# Altium footprint library KF.PcbLib: 39 footprints (part 1 of 3)
Each footprint in its own frame and in the unit in brackets; x right, y up, seen from the top. Pads: shape width x height; smd on the part's side, far side on the other; paste and mask are expansions set on the pad; w line width, h text height; cw(c..) or ccw(c..) is an arc to the next point about the centre after c.
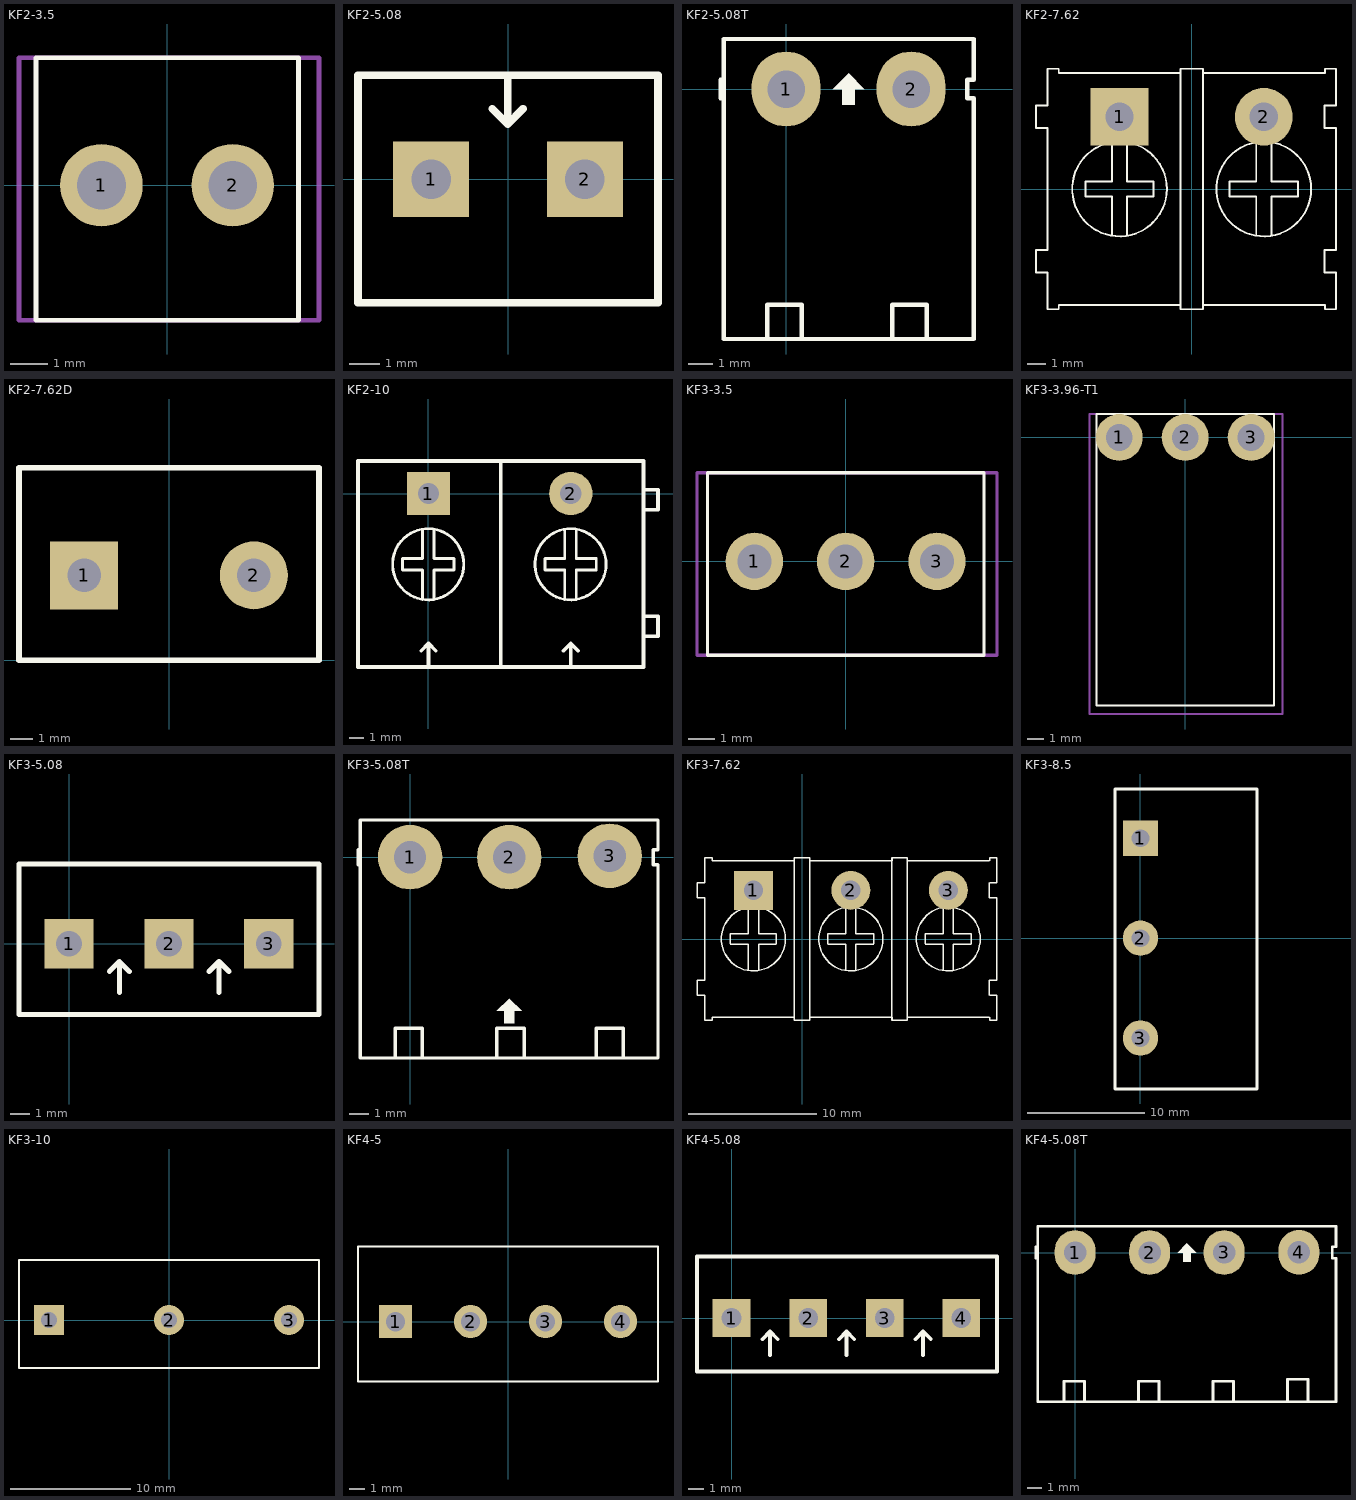
[diagram p0: the footprints below, top view; thin cyan lines are the x and y axes]

## KF2-3.5 [mm] "3,50mm - modular - blue - Horizontal wire entry - Pressure clamp - 8,4mm height - 02p"
height 8.4
pads (2):
  round 2.2 hole 1.3: 1(-1.75,0) 2(1.75,0)
Top Overlay:
  lines w0.127: -3.5,-3.6 3.5,-3.6 3.5,3.4 -3.5,3.4 -3.5,-3.6
Mechanical 13:
  lines w0.127: -3.95,-3.6 -3.95,3.4 4.05,3.4 4.05,-3.6 -3.95,-3.6
3D body "691103110002.stp": height 8.41, standoff -3.79, extent -3.95,-3.6 4.05,3.4

## KF2-5.08 [mm]
pads (2):
  rect 2.5x2.5 hole 1.3: 1(-2.54,0) 2(2.54,0)
Top Overlay:
  lines w0.254: -0.521,2.324 -0.013,1.816 ; -0.013,3.378 -0.013,1.816 ; 0.495,2.324 -0.013,1.816 ; -4.953,-4.077 -4.953,3.429 4.953,3.429 4.953,-4.077 -4.953,-4.077
3D body "SW3DPS-HDR1x2-MED-GREEN.STEP": height 10, standoff -4, extent -5,-4.071 5,3.429

## KF2-5.08T [mil] "Header 2, 2 pin, hight 300mil, Pin to Pin 200, Colour Green"
height 300
pads (2):
  oval 110x120 hole 60: 1(0,0) 2(200,0)
Top Overlay:
  region: 100,25 75,0 90,0 90,-25 110,-25 110,0 125,0
  lines w7: -105,-15 -105,15 ; -30,-400 -30,-345 25,-345 25,-400 ; 170,-400 170,-345 225,-345 225,-400 ; -100,-400 300,-400 300,-15 290,-15 290,15 300,15 300,80 180.5,80 -18.5,80 -100,80 -100,-400
3D body "SW3dPS-5EHDR_2P.STEP": height 333.51, standoff -157.48, extent -96.7,-399.22 297,73.22

## KF2-7.62 [mil]
pads (2):
  rect 120x120 hole 59.06 unplated: 1(-150,150)
  round 120 hole 59.06 unplated: 2(150,150)
Top Overlay:
  circle w4: c-150,0 r98.43
  circle w4: c150,0 r98.43
  lines w4: -323.62,-173.62 -323.62,-126.38 -300,-126.38 -300,126.38 -323.62,126.38 -323.62,173.62 ; -323,-173.62 -300,-173.62 -300,-250 -277,-250 ; -323,173.62 -300,173.62 -300,250 -277,250 ; -276.38,-250 -276.38,-241 -23.62,-241 -23.62,-250 23.62,-250 23.62,-241 276.38,-241 ; -276.38,250 -276.38,241 -23.62,241 -23.62,250 23.62,250 23.62,241 276.38,241 ; -221,-15.75 -165.75,-15.75 ; -221,-15 -221,16 ; -221,15.75 -165.75,15.75 ; -165.75,-97 -165.75,-16 ; -165.75,16 -165.75,97 ; -134.25,-97 -134.25,-16 ; -134.25,-15.75 -79,-15.75 ; -134.25,15.75 -79,15.75 ; -134.25,16 -134.25,97 ; -79,-15 -79,16 ; -23.62,-244 -23.62,245 ; 23.62,-244 23.62,245 ; 79,-15.75 134.25,-15.75 ; 79,-15 79,16 ; 79,15.75 134.25,15.75 ; 134.25,-97 134.25,-16 ; 134.25,16 134.25,97 ; 165.75,-97 165.75,-16 ; 165.75,-15.75 221,-15.75 ; 165.75,15.75 221,15.75 ; 165.75,16 165.75,97 ; 221,-15 221,16 ; 276.38,-173.62 276.38,-126.38 300,-126.38 300,126.38 276.38,126.38 276.38,173.62 ; 277,-241 277,-250 300,-250 300,-173.62 277,-173.62 ; 277,173.62 300,173.62 300,250 277,250 277,241
3D body "691313410002.stp": height 336.61, standoff -155.51, extent -300,-241.22 300,231.22

## KF2-7.62D [mil]
pads (2):
  rect 120x120 hole 59.06 unplated: 1(-150,150)
  round 120 hole 59.06 unplated: 2(150,150)
Top Overlay:
  lines w10: -265,0 265,0 265,340 -265,340 -265,0
3D body "17436.stp": height 472.44, standoff -153.54, extent -264.57,0 264.57,338.58

## KF2-10 [mil]
pads (2):
  rect 120x120 hole 59.06 unplated: 1(0,0)
  round 120 hole 59.06 unplated: 2(393.7,0)
Top Overlay:
  circle w7.87: c-0.75,-195.75 r98.43
  circle w7.87: c392.95,-195.75 r98.43
  lines w7.87: -71.75,-211.5 -16.5,-211.5 ; -71.75,-210.75 -71.75,-179.75 ; -71.75,-180 -16.5,-180 ; -16.5,-292.75 -16.5,-211.75 ; -16.5,-179.75 -16.5,-98.75 ; 15,-292.75 15,-211.75 ; 15,-211.5 70.25,-211.5 ; 15,-180 70.25,-180 ; 15,-179.75 15,-98.75 ; 70.25,-210.75 70.25,-179.75 ; 321.95,-211.5 377.2,-211.5 ; 321.95,-210.75 321.95,-179.75 ; 321.95,-180 377.2,-180 ; 377.2,-292.75 377.2,-211.75 ; 377.2,-179.75 377.2,-98.75 ; 408.7,-292.75 408.7,-211.75 ; 408.7,-211.5 463.95,-211.5 ; 408.7,-180 463.95,-180 ; 408.7,-179.75 408.7,-98.75 ; 463.95,-210.75 463.95,-179.75
  lines w10: -20,-435 0,-415 ; 0,-476.5 0,-415 ; 20,-435 0,-415 ; 200,-480 200,90 ; 373.7,-435 393.7,-415 ; 393.7,-476.5 393.7,-415 ; 413.7,-435 393.7,-415 ; -195,-480 595,-480 595,90 -195,90 -195,-480 ; 595,-395 635,-395 635,-340 595,-340 595,-395 ; 595,-45 635,-45 635,10 595,10 595,-45
3D body "KF1000-2P.step": height 570.87, standoff -332.99, extent -193.39,-480.87 633.39,90

## KF3-3.5 [mm] "3,50mm - modular - blue - Horizontal wire entry - Pressure clamp - 8,4mm height - 03p"
height 8.4
pads (3):
  round 2.2 hole 1.3: 1(-3.5,0) 2(0,0) 3(3.5,0)
Top Overlay:
  lines w0.127: -5.3,-3.6 -5.3,3.4 5.3,3.4 5.3,-3.6 -5.3,-3.6
Mechanical 13:
  lines w0.127: -5.7,-3.6 -5.7,3.4 5.8,3.4 5.8,-3.6 -5.7,-3.6
3D body "691103110003.stp": height 8.41, standoff -3.79, extent -5.7,-3.6 5.8,3.4

## KF3-3.96-T1 [mm] "3,96mm - modular - blue - Horizontal wire entry - Pressure clamp - 10mm height - 03p"
height 10
pads (3):
  round 2.8 hole 1.6: 1(-3.937,0) 2(0,0) 3(3.937,0)
Top Overlay:
  lines w0.127: -5.3,-16.002 5.3,-16.002 5.3,1.397 -5.3,1.397 -5.3,-16.002
Mechanical 13:
  lines w0.127: -5.7,-16.51 5.8,-16.51 5.8,1.397 -5.7,1.397 -5.7,-16.51

## KF3-5.08 [mm]
pads (3):
  rect 2.5x2.5 hole 1.3: 1(0,0) 2(5.08,0) 3(10.147,0)
Top Overlay:
  lines w0.254: 2.045,-1.41 2.553,-0.902 ; 2.553,-2.464 2.553,-0.902 ; 3.061,-1.41 2.553,-0.902 ; 7.112,-1.41 7.62,-0.902 ; 7.62,-2.464 7.62,-0.902 ; 8.128,-1.41 7.62,-0.902 ; -2.54,-3.581 12.7,-3.581 12.7,4.064 -2.54,4.064 -2.54,-3.581
3D body "SW3DPS-HDR1x3-MED-GREEN.STEP": height 10, standoff -4, extent -2.42,-3.505 12.58,3.995

## KF3-5.08T [mil] "Header 3, 3 pin, hight 300mil, Pin to Pin 200, Colour Green"
height 300
pads (3):
  round 130 hole 65: 1(0,0) 2(200,0) 3(402.62,2.62)
Top Overlay:
  region: 200,-285 175,-310 190,-310 190,-335 210,-335 210,-310 225,-310
  lines w7: -105,-15 -105,15 ; -30,-400 -30,-345 25,-345 25,-400 ; 175,-400 175,-345 230,-345 230,-400 ; 375,-400 375,-345 430,-345 430,-400 ; -100,-405 -100,75 500,75 500,15 490,15 490,-15 500,-15 500,-405 -100,-405
3D body "User Library-BigHeader 5EHDR_1P.step": height 124.02, standoff -366.97, extent 299,-404.22 495.85,68.22
3D body "User Library-BigHeader 5EHDR_1P.step": height 124.02, standoff -366.97, extent 102,-404 298.85,68.44
3D body "User Library-BigHeader 5EHDR_1P.step": height 124.02, standoff -366.97, extent -95,-404 101.85,68.44

## KF3-7.62 [mil]
pads (3):
  rect 120x120 hole 59.06 unplated: 1(-150,150)
  round 120 hole 59.06 unplated: 2(150,150) 3(450,150)
Top Overlay:
  circle w4: c450,0 r98.43
  circle w4: c-150,0 r98.43
  circle w4: c150,0 r98.43
  lines w4: -323.62,-173.62 -323.62,-126.38 -300,-126.38 -300,126.38 -323.62,126.38 -323.62,173.62 ; -323,-173.62 -300,-173.62 -300,-250 -277,-250 ; -323,173.62 -300,173.62 -300,250 -277,250 ; -276.38,-250 -276.38,-241 -23.62,-241 -23.62,-250 23.62,-250 23.62,-241 276.38,-241 276.38,-250 323.62,-250 323.62,-241 576.38,-241 ; -276.38,250 -276.38,241 -23.62,241 -23.62,250 23.62,250 23.62,241 276.38,241 276.38,250 323.62,250 323.62,241 576.38,241 ; -221,-15.75 -165.75,-15.75 ; -221,-15 -221,16 ; -221,15.75 -165.75,15.75 ; -165.75,-97 -165.75,-16 ; -165.75,16 -165.75,97 ; -134.25,-97 -134.25,-16 ; -134.25,-15.75 -79,-15.75 ; -134.25,15.75 -79,15.75 ; -134.25,16 -134.25,97 ; -79,-15 -79,16 ; -23.62,-244 -23.62,245 ; 23.62,-244 23.62,245 ; 79,-15.75 134.25,-15.75 ; 79,-15 79,16 ; 79,15.75 134.25,15.75 ; 134.25,-97 134.25,-16 ; 134.25,16 134.25,97 ; 165.75,-97 165.75,-16 ; 165.75,-15.75 221,-15.75 ; 165.75,15.75 221,15.75 ; 165.75,16 165.75,97 ; 221,-15 221,16 ; 276.38,-244 276.38,245 ; 276.38,-173.62 276.38,-126.38 ; 276.38,126.38 276.38,173.62 ; 277,-241 277,-250 300,-250 ; 277,241 277,250 300,250 ; 323.62,-244 323.62,245 ; 379,-15.75 434.25,-15.75 ; 379,-15 379,16 ; 379,15.75 434.25,15.75 ; 434.25,-97 434.25,-16 ; 434.25,16 434.25,97 ; 465.75,-97 465.75,-16 ; 465.75,-15.75 521,-15.75 ; 465.75,15.75 521,15.75 ; 465.75,16 465.75,97 ; 521,-15 521,16 ; 576.38,-173.62 576.38,-126.38 600,-126.38 600,126.38 576.38,126.38 576.38,173.62 ; 577,-241 577,-250 600,-250 600,-173.62 577,-173.62 ; 577,173.62 600,173.62 600,250 577,250 577,241
3D body "691313410003.stp": height 336.61, standoff -155.51, extent -300.01,-241.23 599.99,231.22

## KF3-8.5 [mm]
pads (3):
  rect 3x3 hole 1.5: 1(0,8.509)
  round 3 hole 1.5: 2(0,0.009) 3(0,-8.491)
Top Overlay:
  lines w0.254: -2.159,-12.827 9.906,-12.827 9.906,12.7 -2.159,12.7 -2.159,-12.827
3D body "User Library-KF8500-3P.STEP": height 12.5, standoff -3.75, extent -2.159,-12.75 9.841,12.75

## KF3-10 [mm] "Serie 1368 - 10.00 mm _ 3 pins"
height 13
pads (3):
  rect 2.5x2.5 hole 1.3: 1(-10,0)
  round 2.5 hole 1.3: 2(0,0) 3(10,0)
Top Overlay:
  lines w0.2: -12.5,-4 12.5,-4 12.5,5 -12.5,5 -12.5,-4
3D body "691136810003.stp": height 13.1, standoff -3.9, extent -12.5,-4 12.5,5

## KF4-5 [mm] "Serie 1337 - 5.00 mm_4 pins"
height 13
pads (4):
  rect 2.2x2.2 hole 1.3: 1(-7.5,0)
  round 2.2 hole 1.3: 2(-2.5,0) 3(2.5,0) 4(7.5,0)
Top Overlay:
  lines w0.127: -10,-4 10,-4 10,5 -10,5 -10,-4
3D body "691133710004.stp": height 13, standoff -3.6, extent -10,-4 10,5

## KF4-5.08 [mm]
pads (4):
  rect 2.5x2.5 hole 1.3: 1(0,0) 2(5.08,0) 3(10.147,0) 4(15.215,0)
Top Overlay:
  lines w0.254: 2.045,-1.41 2.553,-0.902 ; 2.553,-2.464 2.553,-0.902 ; 3.061,-1.41 2.553,-0.902 ; 7.112,-1.41 7.62,-0.902 ; 7.62,-2.464 7.62,-0.902 ; 8.128,-1.41 7.62,-0.902 ; 12.179,-1.41 12.687,-0.902 ; 12.687,-2.464 12.687,-0.902 ; 13.195,-1.41 12.687,-0.902 ; -2.286,-3.531 -2.286,4.064 17.577,4.064 17.577,-3.531 -2.286,-3.531
3D body "SW3DPS-HDR1x4-MED-GREEN.STEP": height 10, standoff -4, extent -2.362,-3.429 17.638,4.071

## KF4-5.08T [mil] "Header 4, 4 pin, hight 300mil, Pin to Pin 200, Colour Green"
height 300
pads (4):
  oval 110x120 hole 60: 1(0,0) 2(200,0) 3(400.06,0.06) 4(600.39,0.39)
Top Overlay:
  region: 300,25 275,0 290,0 290,-25 310,-25 310,0 325,0
  lines w7: -105,-15 -105,15 ; -30,-400 -30,-345 25,-345 25,-400 ; 170,-400 170,-345 225,-345 225,-400 ; 370,-400 370,-345 425,-345 425,-400 ; 570,-395 570,-340 625,-340 625,-395 ; -100,-400 700,-400 700,-15 690,-15 690,15 700,15 700,70 -100,70 -100,-400
3D body "User Library-BigHeader 5EHDR_1P.step": height 334.11, standoff -156.88, extent 110,-406.22 306.85,66.22
3D body "User Library-BigHeader 5EHDR_1P.step": height 334.11, standoff -156.88, extent 493.15,-406.22 690,66.22
3D body "User Library-BigHeader 5EHDR_1P.step": height 334.11, standoff -156.88, extent 300,-406.22 496.85,66.22
3D body "User Library-BigHeader 5EHDR_1P.step": height 334.11, standoff -156.88, extent -86.85,-406.22 110,66.22